# Altium footprint library my_lib.PcbLib: 121 footprints (part 8 of 8)
Each footprint in its own frame and in the unit in brackets; x right, y up, seen from the top. Pads: shape width x height; smd on the part's side, far side on the other; paste and mask are expansions set on the pad; w line width, h text height; cw(c..) or ccw(c..) is an arc to the next point about the centre after c.
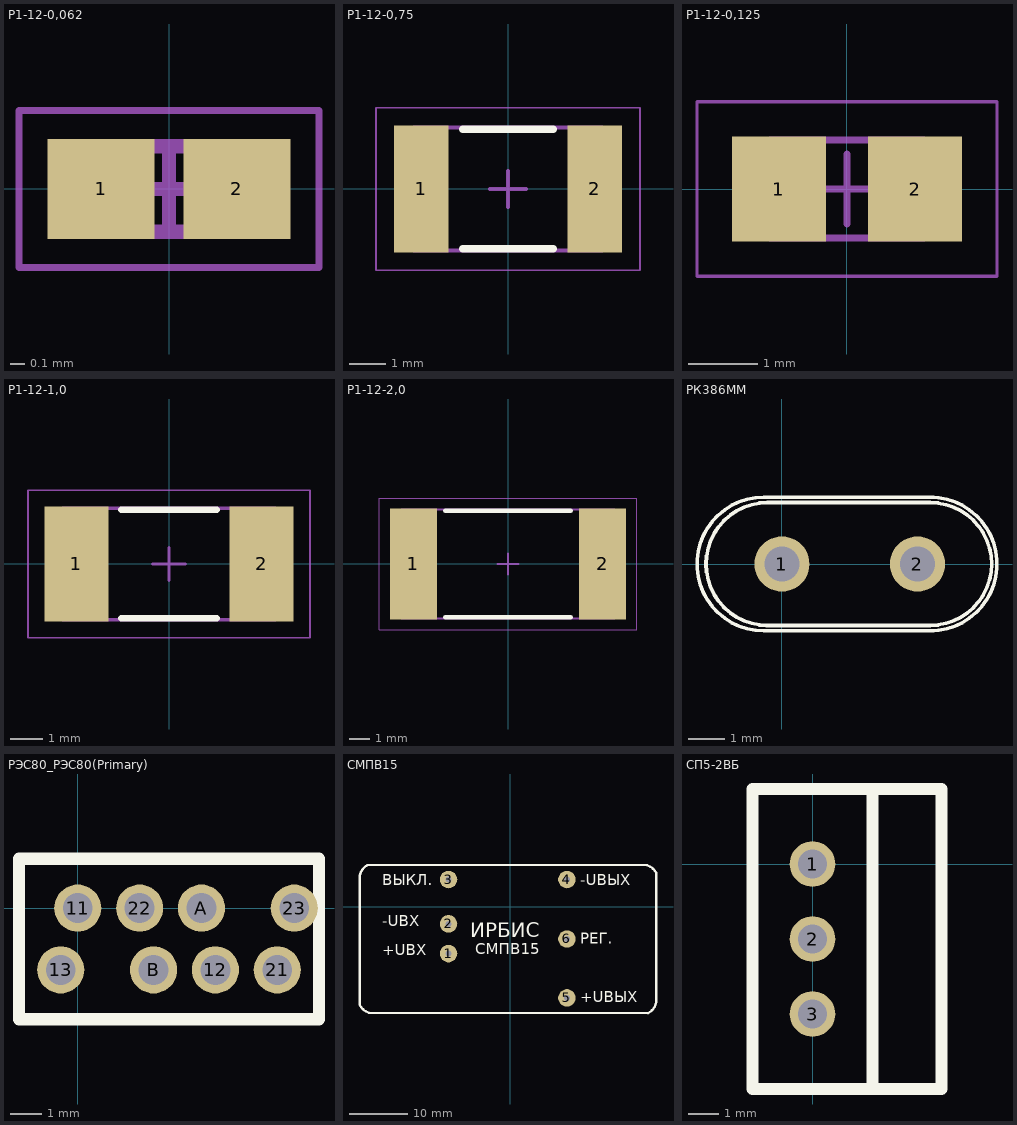
[diagram p7: the footprints below, top view; thin cyan lines are the x and y axes]

## Р1-12-0,062 [mm] "Chip Resistor, 2-Leads, Body 1,00x0,50mm, IPC Low Density"
height 0.5
pads (2):
  rect 0.75x0.7 smd: 1(-0.475,0) 2(0.475,0)
Mechanical 13:
  lines w0.1: -0.55,-0.3 -0.55,0.3 0.55,0.3 0.55,-0.3 -0.55,-0.3
Mechanical 15:
  lines w0.05: -1.05,-0.55 -1.05,0.55 1.05,0.55 1.05,-0.55 -1.05,-0.55
  lines w0.1: -0.3,0 0.3,0 ; 0,-0.3 0,0.3
3D body: height 0.5, standoff 0, extent -0.35,-0.3 0.35,0.3
3D body: height 0.5, standoff 0, extent -0.55,-0.3 -0.35,0.3
3D body: height 0.5, standoff 0, extent 0.35,-0.3 0.55,0.3

## Р1-12-0,75 [mm] "Chip Resistor, 2-Leads, Body 5,00x3,20mm, IPC Low Density"
height 0.8
pads (2):
  rect 1.5x3.5 smd: 1(-2.4,0) 2(2.4,0)
Top Overlay:
  lines w0.2: -1.25,-1.65 1.25,-1.65 ; -1.25,1.65 1.25,1.65
Mechanical 13:
  lines w0.1: -2.6,-1.7 2.6,-1.7 2.6,1.7 -2.6,1.7 -2.6,-1.7
Mechanical 15:
  lines w0.05: -3.65,-2.25 3.65,-2.25 3.65,2.25 -3.65,2.25 -3.65,-2.25
  lines w0.1: -0.5,0 0.5,0 ; 0,-0.5 0,0.5
3D body: height 0.8, standoff 0, extent 2.1,-1.7 2.6,1.7
3D body: height 0.8, standoff 0, extent -2.6,-1.7 -2.1,1.7
3D body: height 0.8, standoff 0, extent -2.1,-1.7 2.1,1.7

## Р1-12-0,125 [mm] "Chip Resistor, 2-Leads, Body 2,00x1,25mm, IPC Low Density"
height 0.6
pads (2):
  rect 1.35x1.5 smd: 1(-0.975,0) 2(0.975,0)
Mechanical 13:
  lines w0.1: -1.1,-0.7 -1.1,0.7 1.1,0.7 1.1,-0.7 -1.1,-0.7
Mechanical 15:
  lines w0.05: -2.15,-1.25 -2.15,1.25 2.15,1.25 2.15,-1.25 -2.15,-1.25
  lines w0.1: -0.5,0 0.5,0 ; 0,-0.5 0,0.5
3D body: height 0.6, standoff 0, extent -0.7,-0.7 0.7,0.7
3D body: height 0.6, standoff 0, extent -1.1,-0.7 -0.7,0.7
3D body: height 0.6, standoff 0, extent 0.7,-0.7 1.1,0.7

## Р1-12-1,0 [mm] "Chip Resistor, 2-Leads, Body 6,30x3,20mm, IPC Low Density"
height 0.8
pads (2):
  rect 1.95x3.5 smd: 1(-2.825,0) 2(2.825,0)
Top Overlay:
  lines w0.2: -1.45,-1.65 1.45,-1.65 ; -1.45,1.65 1.45,1.65
Mechanical 13:
  lines w0.1: -3.25,-1.7 3.25,-1.7 3.25,1.7 -3.25,1.7 -3.25,-1.7
Mechanical 15:
  lines w0.05: -4.3,-2.25 4.3,-2.25 4.3,2.25 -4.3,2.25 -4.3,-2.25
  lines w0.1: -0.5,0 0.5,0 ; 0,-0.5 0,0.5
3D body: height 0.8, standoff 0, extent 2.5,-1.7 3.25,1.7
3D body: height 0.8, standoff 0, extent -3.25,-1.7 -2.5,1.7
3D body: height 0.8, standoff 0, extent -2.5,-1.7 2.5,1.7

## Р1-12-2,0 [mm] "Chip Resistor, 2-Leads, Body 10,00x5,00mm, IPC Low Density"
height 0.8
pads (2):
  rect 2.25x5.3 smd: 1(-4.525,0) 2(4.525,0)
Top Overlay:
  lines w0.2: -3,-2.55 3,-2.55 ; -3,2.55 3,2.55
Mechanical 13:
  lines w0.1: -5.1,-2.6 5.1,-2.6 5.1,2.6 -5.1,2.6 -5.1,-2.6
Mechanical 15:
  lines w0.05: -6.15,-3.15 6.15,-3.15 6.15,3.15 -6.15,3.15 -6.15,-3.15
  lines w0.1: -0.5,0 0.5,0 ; 0,-0.5 0,0.5
3D body: height 0.8, standoff 0, extent 4.1,-2.6 5.1,2.6
3D body: height 0.8, standoff 0, extent -5.1,-2.6 -4.1,2.6
3D body: height 0.8, standoff 0, extent -4.1,-2.6 4.1,2.6

## РК386ММ [mil]
pads (2):
  round 60 hole 38: 1(0,0) 2(147.64,0)
Top Overlay:
  lines w3.94: -16.93,-66.93 160.24,-66.93 ; -15.75,-66.96 cw(c-15.75,0) -15.75,66.96 161.42,66.93 cw(c161.42,0) 161.42,-66.96 ; 161.42,-72.83 ccw(c161.42,0) 161.42,72.83 ; 165.35,-72.83 -19.68,-72.83 cw(c-19.68,0) -19.68,72.83 165.35,72.83

## РЭС80_РЭС80(Primary) [mil]
pads (8):
  round 60 hole 38: 11(0,0) 12(175.2,-78.74) 13(-21.65,-78.74) 21(253.94,-78.74) 22(78.74,0) 23(275.59,0) A(157.48,0) B(96.46,-78.74)
Top Overlay:
  lines w15.75: -74.8,-141.73 307.09,-141.73 307.09,62.99 -74.8,62.99 -74.8,-141.73

## СМПВ15 [mm]
pads (6):
  round 3 hole 1: 1(-10.6,-8) 2(-10.6,-2.9) 3(-10.6,4.7) 4(9.7,4.7) 5(9.7,-15.6) 6(9.7,-5.5)
Top Overlay:
  lines w0.4: -25.8,-16.8 -25.8,5.4 ; -25.798,5.4 cw(c-23.191,4.851) -24.519,7.16 ; -25.76,-16.919 ccw(c-23.451,-15.591) -24,-18.198 ; -24.4,7.2 23.2,7.2 ; -23.9,-18.2 23.7,-18.2 ; 23.2,7.198 cw(c22.651,4.591) 24.96,5.919 ; 23.609,-18.22 ccw(c22.391,-15.851) 25.016,-16.304 ; 25,-16.4 25,5.9
  text "ИРБИС" at -6.879,-6.027 h4.23
  text "СМПВ15" at -5.986,-8.77 h3.17
  text "-UВЫХ" at 12,3 h3.17
  text "РЕГ." at 12,-7 h3.17
  text "ВЫКЛ." at -22,3 h3.17
  text "+UВЫХ" at 12,-17 h3.17
  text "-UВХ" at -22,-4 h3.17
  text "+UВХ" at -22,-9 h3.17

## СП5-2ВБ [mil]
pads (3):
  round 60 hole 38: 1(0,0) 2(0,-98.43) 3(0,-196.85)
Top Overlay:
  lines w15.75: 78.74,-295.28 78.74,98.43 ; -78.74,-295.28 -78.74,98.43 169.29,98.43 169.29,-295.28 -78.74,-295.28